# Altium footprint library con-samtec.PCBLIB: 805 footprints (part 14 of 55)
Each footprint in its own frame and in the unit in brackets; x right, y up, seen from the top. Pads: shape width x height; smd on the part's side, far side on the other; paste and mask are expansions set on the pad; w line width, h text height; cw(c..) or ccw(c..) is an arc to the next point about the centre after c.
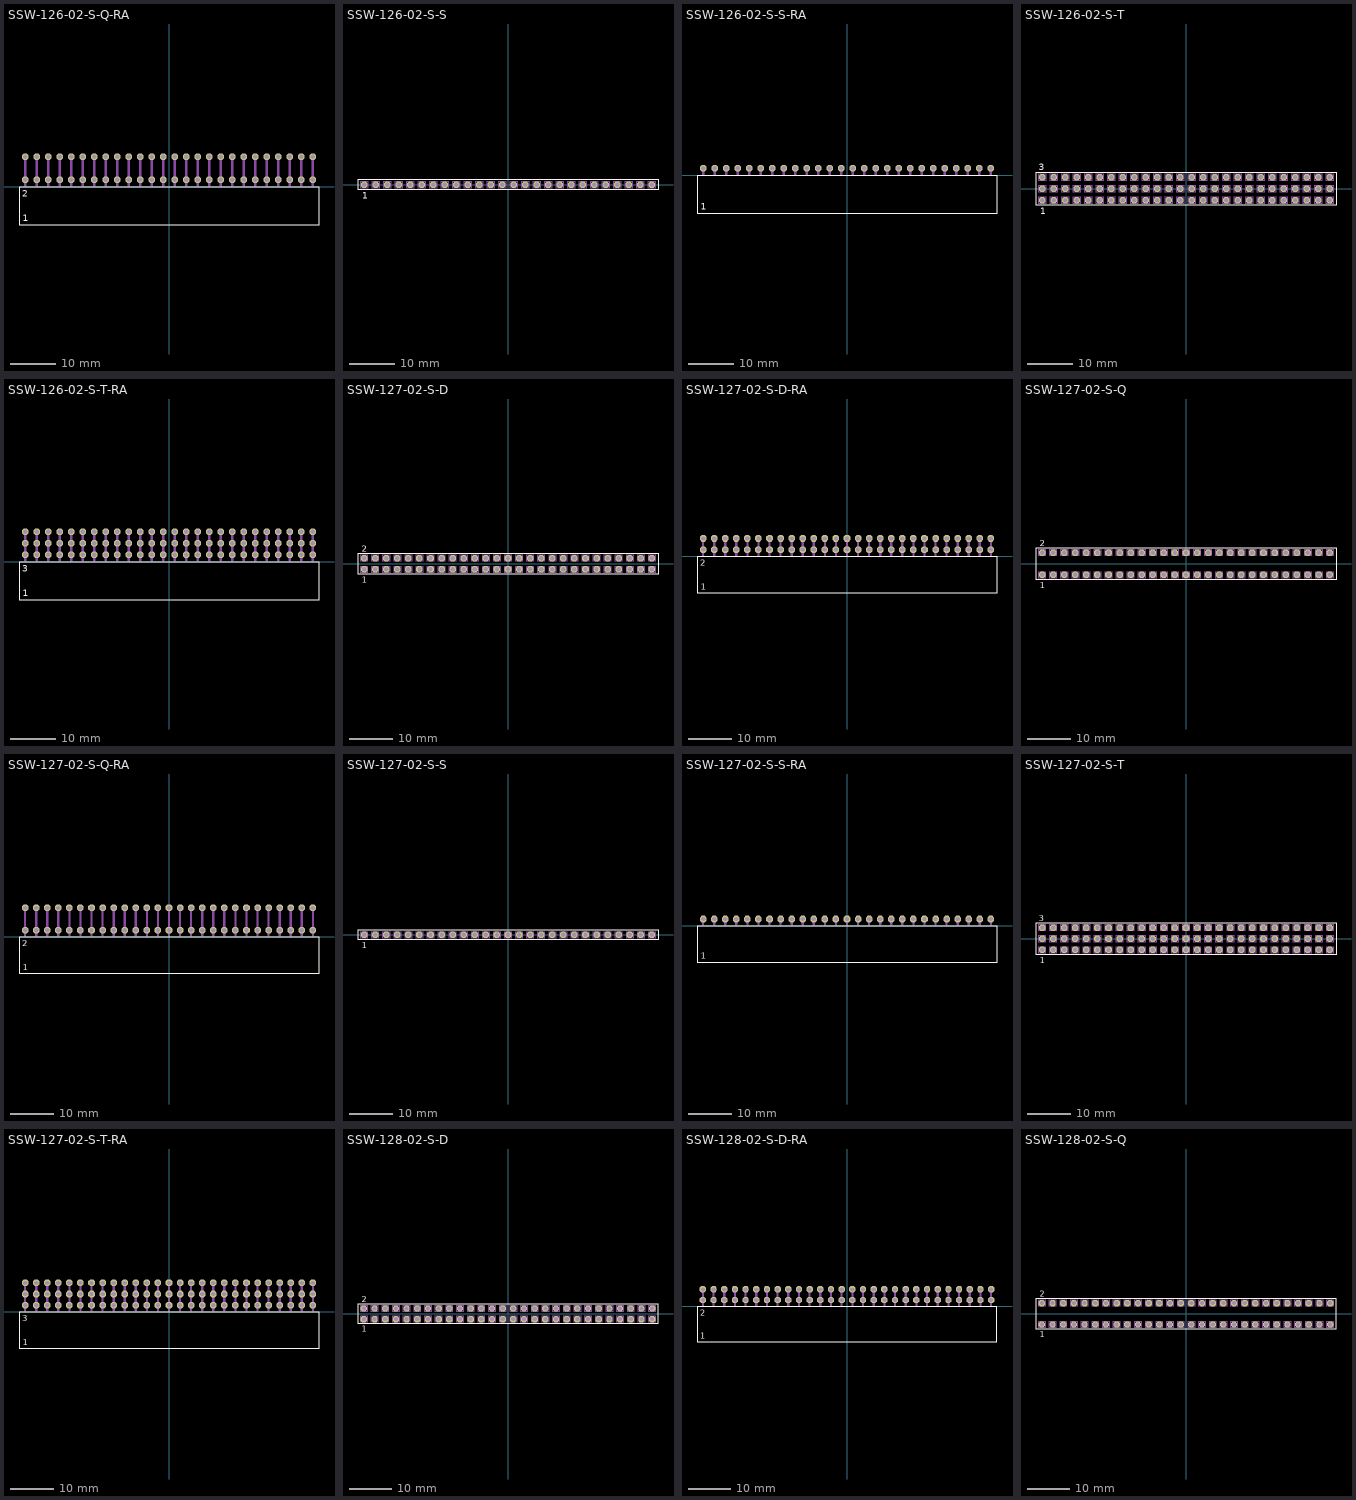
[diagram p13: the footprints below, top view; thin cyan lines are the x and y axes]

## SSW-126-02-S-Q-RA [mil]
pads (52):
  oct 59.06x59.06 hole 39.37: 1(-1250,60) 2(-1250,260) 3(-1150,60) 4(-1150,260) 5(-1050,60) 6(-1050,260) 7(-950,60) 8(-950,260) 9(-850,60) 10(-850,260) 11(-750,60) 12(-750,260) 13(-650,60) 14(-650,260) 15(-550,60) 16(-550,260) 17(-450,60) 18(-450,260) 19(-350,60) 20(-350,260) 21(-250,60) 22(-250,260) 23(-150,60) 24(-150,260) 25(-50,60) 26(-50,260) 27(50,60) 28(50,260) 29(150,60) 30(150,260) 31(250,60) 32(250,260) 33(350,60) 34(350,260) 35(450,60) 36(450,260) 37(550,60) 38(550,260) 39(650,60) 40(650,260) 41(750,60) 42(750,260) 43(850,60) 44(850,260) 45(950,60) 46(950,260) 47(1050,60) 48(1050,260) 49(1150,60) 50(1150,260) 51(1250,60) 52(1250,260)
Top Overlay:
  lines w8: -1305.08,-330.55 1305.08,-330.55 1305.08,-4.17 -1305.08,-4.17 -1305.08,-330.55
  text "1" at -1273.43,-301.18 h56.1
  text "2" at -1276.38,-86.61 h56.1
Mechanical 16:
  rectangle: -1260,0 -1240,270
  rectangle: -1160,0 -1140,270
  rectangle: -1060,0 -1040,270
  rectangle: -960,0 -940,270
  rectangle: -860,0 -840,270
  rectangle: -760,0 -740,270
  rectangle: -660,0 -640,270
  rectangle: -560,0 -540,270
  rectangle: -460,0 -440,270
  rectangle: -360,0 -340,270
  rectangle: -260,0 -240,270
  rectangle: -160,0 -140,270
  rectangle: -60,0 -40,270
  rectangle: 40,0 60,270
  rectangle: 140,0 160,270
  rectangle: 240,0 260,270
  rectangle: 340,0 360,270
  rectangle: 440,0 460,270
  rectangle: 540,0 560,270
  rectangle: 640,0 660,270
  rectangle: 740,0 760,270
  rectangle: 840,0 860,270
  rectangle: 940,0 960,270
  rectangle: 1040,0 1060,270
  rectangle: 1140,0 1160,270
  rectangle: 1240,0 1260,270

## SSW-126-02-S-S [mm]
pads (26):
  oct 1.5x1.5 hole 1: 1(-31.75,0) 2(-29.21,0) 3(-26.67,0) 4(-24.13,0) 5(-21.59,0) 6(-19.05,0) 7(-16.51,0) 8(-13.97,0) 9(-11.43,0) 10(-8.89,0) 11(-6.35,0) 12(-3.81,0) 13(-1.27,0) 14(1.27,0) 15(3.81,0) 16(6.35,0) 17(8.89,0) 18(11.43,0) 19(13.97,0) 20(16.51,0) 21(19.05,0) 22(21.59,0) 23(24.13,0) 24(26.67,0) 25(29.21,0) 26(31.75,0)
Top Overlay:
  lines w0.203: -33.149,-1.155 33.149,-1.155 33.149,1.155 -33.149,1.155 -33.149,-1.155
  text "1" at -32.258,-3.048 h1.42
Mechanical 16:
  lines w0.203: -32.495,-0.745 -30.995,-0.745 -30.995,0.755 -32.495,0.755 -32.495,-0.745 ; -29.955,-0.745 -28.455,-0.745 -28.455,0.755 -29.955,0.755 -29.955,-0.745 ; -27.415,-0.745 -25.915,-0.745 -25.915,0.755 -27.415,0.755 -27.415,-0.745 ; -24.875,-0.745 -23.375,-0.745 -23.375,0.755 -24.875,0.755 -24.875,-0.745 ; -22.335,-0.745 -20.835,-0.745 -20.835,0.755 -22.335,0.755 -22.335,-0.745 ; -19.795,-0.745 -18.295,-0.745 -18.295,0.755 -19.795,0.755 -19.795,-0.745 ; -17.255,-0.745 -15.755,-0.745 -15.755,0.755 -17.255,0.755 -17.255,-0.745 ; -14.715,-0.745 -13.215,-0.745 -13.215,0.755 -14.715,0.755 -14.715,-0.745 ; -12.175,-0.745 -10.675,-0.745 -10.675,0.755 -12.175,0.755 -12.175,-0.745 ; -9.635,-0.745 -8.135,-0.745 -8.135,0.755 -9.635,0.755 -9.635,-0.745 ; -7.095,-0.745 -5.595,-0.745 -5.595,0.755 -7.095,0.755 -7.095,-0.745 ; -4.555,-0.745 -3.055,-0.745 -3.055,0.755 -4.555,0.755 -4.555,-0.745 ; -2.015,-0.745 -0.515,-0.745 -0.515,0.755 -2.015,0.755 -2.015,-0.745 ; 0.525,-0.745 2.025,-0.745 2.025,0.755 0.525,0.755 0.525,-0.745 ; 3.065,-0.745 4.565,-0.745 4.565,0.755 3.065,0.755 3.065,-0.745 ; 5.605,-0.745 7.105,-0.745 7.105,0.755 5.605,0.755 5.605,-0.745 ; 8.145,-0.745 9.645,-0.745 9.645,0.755 8.145,0.755 8.145,-0.745 ; 10.685,-0.745 12.185,-0.745 12.185,0.755 10.685,0.755 10.685,-0.745 ; 13.225,-0.745 14.725,-0.745 14.725,0.755 13.225,0.755 13.225,-0.745 ; 15.765,-0.745 17.265,-0.745 17.265,0.755 15.765,0.755 15.765,-0.745 ; 18.305,-0.745 19.805,-0.745 19.805,0.755 18.305,0.755 18.305,-0.745 ; 20.845,-0.745 22.345,-0.745 22.345,0.755 20.845,0.755 20.845,-0.745 ; 23.385,-0.745 24.885,-0.745 24.885,0.755 23.385,0.755 23.385,-0.745 ; 25.925,-0.745 27.425,-0.745 27.425,0.755 25.925,0.755 25.925,-0.745 ; 28.465,-0.745 29.965,-0.745 29.965,0.755 28.465,0.755 28.465,-0.745 ; 31.005,-0.745 32.505,-0.745 32.505,0.755 31.005,0.755 31.005,-0.745

## SSW-126-02-S-S-RA [mil]
pads (26):
  oct 59.06x59.06 hole 39.37: 1(-1250,60) 2(-1150,60) 3(-1050,60) 4(-950,60) 5(-850,60) 6(-750,60) 7(-650,60) 8(-550,60) 9(-450,60) 10(-350,60) 11(-250,60) 12(-150,60) 13(-50,60) 14(50,60) 15(150,60) 16(250,60) 17(350,60) 18(450,60) 19(550,60) 20(650,60) 21(750,60) 22(850,60) 23(950,60) 24(1050,60) 25(1150,60) 26(1250,60)
Top Overlay:
  lines w8: -1305.08,-330.55 1305.08,-330.55 1305.08,-4.17 -1305.08,-4.17 -1305.08,-330.55
  text "1" at -1273.43,-301.18 h56.1
Mechanical 16:
  rectangle: -1260,0 -1240,70
  rectangle: -1160,0 -1140,70
  rectangle: -1060,0 -1040,70
  rectangle: -960,0 -940,70
  rectangle: -860,0 -840,70
  rectangle: -760,0 -740,70
  rectangle: -660,0 -640,70
  rectangle: -560,0 -540,70
  rectangle: -460,0 -440,70
  rectangle: -360,0 -340,70
  rectangle: -260,0 -240,70
  rectangle: -160,0 -140,70
  rectangle: -60,0 -40,70
  rectangle: 40,0 60,70
  rectangle: 140,0 160,70
  rectangle: 240,0 260,70
  rectangle: 340,0 360,70
  rectangle: 440,0 460,70
  rectangle: 540,0 560,70
  rectangle: 640,0 660,70
  rectangle: 740,0 760,70
  rectangle: 840,0 860,70
  rectangle: 940,0 960,70
  rectangle: 1040,0 1060,70
  rectangle: 1140,0 1160,70
  rectangle: 1240,0 1260,70

## SSW-126-02-S-T [mm]
pads (78):
  oct 1.5x1.5 hole 1: 1(-31.75,-2.54) 2(-31.75,0) 3(-31.75,2.54) 4(-29.21,-2.54) 5(-29.21,0) 6(-29.21,2.54) 7(-26.67,-2.54) 8(-26.67,0) 9(-26.67,2.54) 10(-24.13,-2.54) 11(-24.13,0) 12(-24.13,2.54) 13(-21.59,-2.54) 14(-21.59,0) 15(-21.59,2.54) 16(-19.05,-2.54) 17(-19.05,0) 18(-19.05,2.54) 19(-16.51,-2.54) 20(-16.51,0) 21(-16.51,2.54) 22(-13.97,-2.54) 23(-13.97,0) 24(-13.97,2.54) 25(-11.43,-2.54) 26(-11.43,0) 27(-11.43,2.54) 28(-8.89,-2.54) 29(-8.89,0) 30(-8.89,2.54) 31(-6.35,-2.54) 32(-6.35,0) 33(-6.35,2.54) 34(-3.81,-2.54) 35(-3.81,0) 36(-3.81,2.54) 37(-1.27,-2.54) 38(-1.27,0) 39(-1.27,2.54) 40(1.27,-2.54) 41(1.27,0) 42(1.27,2.54) 43(3.81,-2.54) 44(3.81,0) 45(3.81,2.54) 46(6.35,-2.54) 47(6.35,0) 48(6.35,2.54) 49(8.89,-2.54) 50(8.89,0) 51(8.89,2.54) 52(11.43,-2.54) 53(11.43,0) 54(11.43,2.54) 55(13.97,-2.54) 56(13.97,0) 57(13.97,2.54) 58(16.51,-2.54) 59(16.51,0) 60(16.51,2.54) 61(19.05,-2.54) 62(19.05,0) 63(19.05,2.54) 64(21.59,-2.54) 65(21.59,0) 66(21.59,2.54) 67(24.13,-2.54) 68(24.13,0) 69(24.13,2.54) 70(26.67,-2.54) 71(26.67,0) 72(26.67,2.54) 73(29.21,-2.54) 74(29.21,0) 75(29.21,2.54) 76(31.75,-2.54) 77(31.75,0) 78(31.75,2.54)
Top Overlay:
  lines w0.203: -33.149,-3.695 33.149,-3.695 33.149,3.695 -33.149,3.695 -33.149,-3.695
  text "1" at -32.258,-5.588 h1.42
  text "3" at -32.512,4.064 h1.42
Mechanical 16:
  drawing of 312 lines, arcs and shapes, not listed

## SSW-126-02-S-T-RA [mil]
pads (78):
  oct 59.06x59.06 hole 39.37: 1(-1250,60) 2(-1250,160) 3(-1250,260) 4(-1150,60) 5(-1150,160) 6(-1150,260) 7(-1050,60) 8(-1050,160) 9(-1050,260) 10(-950,60) 11(-950,160) 12(-950,260) 13(-850,60) 14(-850,160) 15(-850,260) 16(-750,60) 17(-750,160) 18(-750,260) 19(-650,60) 20(-650,160) 21(-650,260) 22(-550,60) 23(-550,160) 24(-550,260) 25(-450,60) 26(-450,160) 27(-450,260) 28(-350,60) 29(-350,160) 30(-350,260) 31(-250,60) 32(-250,160) 33(-250,260) 34(-150,60) 35(-150,160) 36(-150,260) 37(-50,60) 38(-50,160) 39(-50,260) 40(50,60) 41(50,160) 42(50,260) 43(150,60) 44(150,160) 45(150,260) 46(250,60) 47(250,160) 48(250,260) 49(350,60) 50(350,160) 51(350,260) 52(450,60) 53(450,160) 54(450,260) 55(550,60) 56(550,160) 57(550,260) 58(650,60) 59(650,160) 60(650,260) 61(750,60) 62(750,160) 63(750,260) 64(850,60) 65(850,160) 66(850,260) 67(950,60) 68(950,160) 69(950,260) 70(1050,60) 71(1050,160) 72(1050,260) 73(1150,60) 74(1150,160) 75(1150,260) 76(1250,60) 77(1250,160) 78(1250,260)
Top Overlay:
  lines w8: -1305.08,-330.55 1305.08,-330.55 1305.08,-4.17 -1305.08,-4.17 -1305.08,-330.55
  text "1" at -1273.43,-301.18 h56.1
  text "3" at -1276.38,-86.61 h56.1
Mechanical 16:
  rectangle: -1260,0 -1240,270
  rectangle: -1160,0 -1140,270
  rectangle: -1060,0 -1040,270
  rectangle: -960,0 -940,270
  rectangle: -860,0 -840,270
  rectangle: -760,0 -740,270
  rectangle: -660,0 -640,270
  rectangle: -560,0 -540,270
  rectangle: -460,0 -440,270
  rectangle: -360,0 -340,270
  rectangle: -260,0 -240,270
  rectangle: -160,0 -140,270
  rectangle: -60,0 -40,270
  rectangle: 40,0 60,270
  rectangle: 140,0 160,270
  rectangle: 240,0 260,270
  rectangle: 340,0 360,270
  rectangle: 440,0 460,270
  rectangle: 540,0 560,270
  rectangle: 640,0 660,270
  rectangle: 740,0 760,270
  rectangle: 840,0 860,270
  rectangle: 940,0 960,270
  rectangle: 1040,0 1060,270
  rectangle: 1140,0 1160,270
  rectangle: 1240,0 1260,270

## SSW-127-02-S-D [mm]
pads (54):
  oct 1.5x1.5 hole 1: 1(-33.02,-1.27) 2(-33.02,1.27) 3(-30.48,-1.27) 4(-30.48,1.27) 5(-27.94,-1.27) 6(-27.94,1.27) 7(-25.4,-1.27) 8(-25.4,1.27) 9(-22.86,-1.27) 10(-22.86,1.27) 11(-20.32,-1.27) 12(-20.32,1.27) 13(-17.78,-1.27) 14(-17.78,1.27) 15(-15.24,-1.27) 16(-15.24,1.27) 17(-12.7,-1.27) 18(-12.7,1.27) 19(-10.16,-1.27) 20(-10.16,1.27) 21(-7.62,-1.27) 22(-7.62,1.27) 23(-5.08,-1.27) 24(-5.08,1.27) 25(-2.54,-1.27) 26(-2.54,1.27) 27(0,-1.27) 28(0,1.27) 29(2.54,-1.27) 30(2.54,1.27) 31(5.08,-1.27) 32(5.08,1.27) 33(7.62,-1.27) 34(7.62,1.27) 35(10.16,-1.27) 36(10.16,1.27) 37(12.7,-1.27) 38(12.7,1.27) 39(15.24,-1.27) 40(15.24,1.27) 41(17.78,-1.27) 42(17.78,1.27) 43(20.32,-1.27) 44(20.32,1.27) 45(22.86,-1.27) 46(22.86,1.27) 47(25.4,-1.27) 48(25.4,1.27) 49(27.94,-1.27) 50(27.94,1.27) 51(30.48,-1.27) 52(30.48,1.27) 53(33.02,-1.27) 54(33.02,1.27)
Top Overlay:
  lines w0.203: -34.419,-2.425 34.419,-2.425 34.419,2.425 -34.419,2.425 -34.419,-2.425
  text "1" at -33.528,-4.318 h1.42
  text "2" at -33.528,2.794 h1.42
Mechanical 16:
  drawing of 216 lines, arcs and shapes, not listed

## SSW-127-02-S-D-RA [mil]
pads (54):
  oct 59.06x59.06 hole 39.37: 1(-1300,60) 2(-1300,160) 3(-1200,60) 4(-1200,160) 5(-1100,60) 6(-1100,160) 7(-1000,60) 8(-1000,160) 9(-900,60) 10(-900,160) 11(-800,60) 12(-800,160) 13(-700,60) 14(-700,160) 15(-600,60) 16(-600,160) 17(-500,60) 18(-500,160) 19(-400,60) 20(-400,160) 21(-300,60) 22(-300,160) 23(-200,60) 24(-200,160) 25(-100,60) 26(-100,160) 27(0,60) 28(0,160) 29(100,60) 30(100,160) 31(200,60) 32(200,160) 33(300,60) 34(300,160) 35(400,60) 36(400,160) 37(500,60) 38(500,160) 39(600,60) 40(600,160) 41(700,60) 42(700,160) 43(800,60) 44(800,160) 45(900,60) 46(900,160) 47(1000,60) 48(1000,160) 49(1100,60) 50(1100,160) 51(1200,60) 52(1200,160) 53(1300,60) 54(1300,160)
Top Overlay:
  lines w8: -1355.08,-330.55 1355.08,-330.55 1355.08,-4.17 -1355.08,-4.17 -1355.08,-330.55
  text "1" at -1323.43,-301.18 h56.1
  text "2" at -1326.38,-86.61 h56.1
Mechanical 16:
  rectangle: -1310,0 -1290,170
  rectangle: -1210,0 -1190,170
  rectangle: -1110,0 -1090,170
  rectangle: -1010,0 -990,170
  rectangle: -910,0 -890,170
  rectangle: -810,0 -790,170
  rectangle: -710,0 -690,170
  rectangle: -610,0 -590,170
  rectangle: -510,0 -490,170
  rectangle: -410,0 -390,170
  rectangle: -310,0 -290,170
  rectangle: -210,0 -190,170
  rectangle: -110,0 -90,170
  rectangle: -10,0 10,170
  rectangle: 90,0 110,170
  rectangle: 190,0 210,170
  rectangle: 290,0 310,170
  rectangle: 390,0 410,170
  rectangle: 490,0 510,170
  rectangle: 590,0 610,170
  rectangle: 690,0 710,170
  rectangle: 790,0 810,170
  rectangle: 890,0 910,170
  rectangle: 990,0 1010,170
  rectangle: 1090,0 1110,170
  rectangle: 1190,0 1210,170
  rectangle: 1290,0 1310,170

## SSW-127-02-S-Q [mm]
pads (54):
  oct 1.5x1.5 hole 1: 1(-33.02,-2.54) 2(-33.02,2.54) 3(-30.48,-2.54) 4(-30.48,2.54) 5(-27.94,-2.54) 6(-27.94,2.54) 7(-25.4,-2.54) 8(-25.4,2.54) 9(-22.86,-2.54) 10(-22.86,2.54) 11(-20.32,-2.54) 12(-20.32,2.54) 13(-17.78,-2.54) 14(-17.78,2.54) 15(-15.24,-2.54) 16(-15.24,2.54) 17(-12.7,-2.54) 18(-12.7,2.54) 19(-10.16,-2.54) 20(-10.16,2.54) 21(-7.62,-2.54) 22(-7.62,2.54) 23(-5.08,-2.54) 24(-5.08,2.54) 25(-2.54,-2.54) 26(-2.54,2.54) 27(0,-2.54) 28(0,2.54) 29(2.54,-2.54) 30(2.54,2.54) 31(5.08,-2.54) 32(5.08,2.54) 33(7.62,-2.54) 34(7.62,2.54) 35(10.16,-2.54) 36(10.16,2.54) 37(12.7,-2.54) 38(12.7,2.54) 39(15.24,-2.54) 40(15.24,2.54) 41(17.78,-2.54) 42(17.78,2.54) 43(20.32,-2.54) 44(20.32,2.54) 45(22.86,-2.54) 46(22.86,2.54) 47(25.4,-2.54) 48(25.4,2.54) 49(27.94,-2.54) 50(27.94,2.54) 51(30.48,-2.54) 52(30.48,2.54) 53(33.02,-2.54) 54(33.02,2.54)
Top Overlay:
  lines w0.203: -34.419,-3.695 34.419,-3.695 34.419,3.695 -34.419,3.695 -34.419,-3.695
  text "1" at -33.528,-5.588 h1.42
  text "2" at -33.528,4.064 h1.42
Mechanical 16:
  drawing of 216 lines, arcs and shapes, not listed

## SSW-127-02-S-Q-RA [mil]
pads (54):
  oct 59.06x59.06 hole 39.37: 1(-1300,60) 2(-1300,260) 3(-1200,60) 4(-1200,260) 5(-1100,60) 6(-1100,260) 7(-1000,60) 8(-1000,260) 9(-900,60) 10(-900,260) 11(-800,60) 12(-800,260) 13(-700,60) 14(-700,260) 15(-600,60) 16(-600,260) 17(-500,60) 18(-500,260) 19(-400,60) 20(-400,260) 21(-300,60) 22(-300,260) 23(-200,60) 24(-200,260) 25(-100,60) 26(-100,260) 27(0,60) 28(0,260) 29(100,60) 30(100,260) 31(200,60) 32(200,260) 33(300,60) 34(300,260) 35(400,60) 36(400,260) 37(500,60) 38(500,260) 39(600,60) 40(600,260) 41(700,60) 42(700,260) 43(800,60) 44(800,260) 45(900,60) 46(900,260) 47(1000,60) 48(1000,260) 49(1100,60) 50(1100,260) 51(1200,60) 52(1200,260) 53(1300,60) 54(1300,260)
Top Overlay:
  lines w8: -1355.08,-330.55 1355.08,-330.55 1355.08,-4.17 -1355.08,-4.17 -1355.08,-330.55
  text "1" at -1323.43,-301.18 h56.1
  text "2" at -1326.38,-86.61 h56.1
Mechanical 16:
  rectangle: -1310,0 -1290,270
  rectangle: -1210,0 -1190,270
  rectangle: -1110,0 -1090,270
  rectangle: -1010,0 -990,270
  rectangle: -910,0 -890,270
  rectangle: -810,0 -790,270
  rectangle: -710,0 -690,270
  rectangle: -610,0 -590,270
  rectangle: -510,0 -490,270
  rectangle: -410,0 -390,270
  rectangle: -310,0 -290,270
  rectangle: -210,0 -190,270
  rectangle: -110,0 -90,270
  rectangle: -10,0 10,270
  rectangle: 90,0 110,270
  rectangle: 190,0 210,270
  rectangle: 290,0 310,270
  rectangle: 390,0 410,270
  rectangle: 490,0 510,270
  rectangle: 590,0 610,270
  rectangle: 690,0 710,270
  rectangle: 790,0 810,270
  rectangle: 890,0 910,270
  rectangle: 990,0 1010,270
  rectangle: 1090,0 1110,270
  rectangle: 1190,0 1210,270
  rectangle: 1290,0 1310,270

## SSW-127-02-S-S [mm]
pads (27):
  oct 1.5x1.5 hole 1: 1(-33.02,0) 2(-30.48,0) 3(-27.94,0) 4(-25.4,0) 5(-22.86,0) 6(-20.32,0) 7(-17.78,0) 8(-15.24,0) 9(-12.7,0) 10(-10.16,0) 11(-7.62,0) 12(-5.08,0) 13(-2.54,0) 14(0,0) 15(2.54,0) 16(5.08,0) 17(7.62,0) 18(10.16,0) 19(12.7,0) 20(15.24,0) 21(17.78,0) 22(20.32,0) 23(22.86,0) 24(25.4,0) 25(27.94,0) 26(30.48,0) 27(33.02,0)
Top Overlay:
  lines w0.203: -34.419,-1.155 34.419,-1.155 34.419,1.155 -34.419,1.155 -34.419,-1.155
  text "1" at -33.528,-3.048 h1.42
Mechanical 16:
  lines w0.203: -33.765,-0.745 -32.265,-0.745 -32.265,0.755 -33.765,0.755 -33.765,-0.745 ; -31.225,-0.745 -29.725,-0.745 -29.725,0.755 -31.225,0.755 -31.225,-0.745 ; -28.685,-0.745 -27.185,-0.745 -27.185,0.755 -28.685,0.755 -28.685,-0.745 ; -26.145,-0.745 -24.645,-0.745 -24.645,0.755 -26.145,0.755 -26.145,-0.745 ; -23.605,-0.745 -22.105,-0.745 -22.105,0.755 -23.605,0.755 -23.605,-0.745 ; -21.065,-0.745 -19.565,-0.745 -19.565,0.755 -21.065,0.755 -21.065,-0.745 ; -18.525,-0.745 -17.025,-0.745 -17.025,0.755 -18.525,0.755 -18.525,-0.745 ; -15.985,-0.745 -14.485,-0.745 -14.485,0.755 -15.985,0.755 -15.985,-0.745 ; -13.445,-0.745 -11.945,-0.745 -11.945,0.755 -13.445,0.755 -13.445,-0.745 ; -10.905,-0.745 -9.405,-0.745 -9.405,0.755 -10.905,0.755 -10.905,-0.745 ; -8.365,-0.745 -6.865,-0.745 -6.865,0.755 -8.365,0.755 -8.365,-0.745 ; -5.825,-0.745 -4.325,-0.745 -4.325,0.755 -5.825,0.755 -5.825,-0.745 ; -3.285,-0.745 -1.785,-0.745 -1.785,0.755 -3.285,0.755 -3.285,-0.745 ; -0.745,-0.745 0.755,-0.745 0.755,0.755 -0.745,0.755 -0.745,-0.745 ; 1.795,-0.745 3.295,-0.745 3.295,0.755 1.795,0.755 1.795,-0.745 ; 4.335,-0.745 5.835,-0.745 5.835,0.755 4.335,0.755 4.335,-0.745 ; 6.875,-0.745 8.375,-0.745 8.375,0.755 6.875,0.755 6.875,-0.745 ; 9.415,-0.745 10.915,-0.745 10.915,0.755 9.415,0.755 9.415,-0.745 ; 11.955,-0.745 13.455,-0.745 13.455,0.755 11.955,0.755 11.955,-0.745 ; 14.495,-0.745 15.995,-0.745 15.995,0.755 14.495,0.755 14.495,-0.745 ; 17.035,-0.745 18.535,-0.745 18.535,0.755 17.035,0.755 17.035,-0.745 ; 19.575,-0.745 21.075,-0.745 21.075,0.755 19.575,0.755 19.575,-0.745 ; 22.115,-0.745 23.615,-0.745 23.615,0.755 22.115,0.755 22.115,-0.745 ; 24.655,-0.745 26.155,-0.745 26.155,0.755 24.655,0.755 24.655,-0.745 ; 27.195,-0.745 28.695,-0.745 28.695,0.755 27.195,0.755 27.195,-0.745 ; 29.735,-0.745 31.235,-0.745 31.235,0.755 29.735,0.755 29.735,-0.745 ; 32.275,-0.745 33.775,-0.745 33.775,0.755 32.275,0.755 32.275,-0.745

## SSW-127-02-S-S-RA [mil]
pads (27):
  oct 59.06x59.06 hole 39.37: 1(-1300,60) 2(-1200,60) 3(-1100,60) 4(-1000,60) 5(-900,60) 6(-800,60) 7(-700,60) 8(-600,60) 9(-500,60) 10(-400,60) 11(-300,60) 12(-200,60) 13(-100,60) 14(0,60) 15(100,60) 16(200,60) 17(300,60) 18(400,60) 19(500,60) 20(600,60) 21(700,60) 22(800,60) 23(900,60) 24(1000,60) 25(1100,60) 26(1200,60) 27(1300,60)
Top Overlay:
  lines w8: -1355.08,-330.55 1355.08,-330.55 1355.08,-4.17 -1355.08,-4.17 -1355.08,-330.55
  text "1" at -1323.43,-301.18 h56.1
Mechanical 16:
  rectangle: -1310,0 -1290,70
  rectangle: -1210,0 -1190,70
  rectangle: -1110,0 -1090,70
  rectangle: -1010,0 -990,70
  rectangle: -910,0 -890,70
  rectangle: -810,0 -790,70
  rectangle: -710,0 -690,70
  rectangle: -610,0 -590,70
  rectangle: -510,0 -490,70
  rectangle: -410,0 -390,70
  rectangle: -310,0 -290,70
  rectangle: -210,0 -190,70
  rectangle: -110,0 -90,70
  rectangle: -10,0 10,70
  rectangle: 90,0 110,70
  rectangle: 190,0 210,70
  rectangle: 290,0 310,70
  rectangle: 390,0 410,70
  rectangle: 490,0 510,70
  rectangle: 590,0 610,70
  rectangle: 690,0 710,70
  rectangle: 790,0 810,70
  rectangle: 890,0 910,70
  rectangle: 990,0 1010,70
  rectangle: 1090,0 1110,70
  rectangle: 1190,0 1210,70
  rectangle: 1290,0 1310,70

## SSW-127-02-S-T [mm]
pads (81):
  oct 1.5x1.5 hole 1: 1(-33.02,-2.54) 2(-33.02,0) 3(-33.02,2.54) 4(-30.48,-2.54) 5(-30.48,0) 6(-30.48,2.54) 7(-27.94,-2.54) 8(-27.94,0) 9(-27.94,2.54) 10(-25.4,-2.54) 11(-25.4,0) 12(-25.4,2.54) 13(-22.86,-2.54) 14(-22.86,0) 15(-22.86,2.54) 16(-20.32,-2.54) 17(-20.32,0) 18(-20.32,2.54) 19(-17.78,-2.54) 20(-17.78,0) 21(-17.78,2.54) 22(-15.24,-2.54) 23(-15.24,0) 24(-15.24,2.54) 25(-12.7,-2.54) 26(-12.7,0) 27(-12.7,2.54) 28(-10.16,-2.54) 29(-10.16,0) 30(-10.16,2.54) 31(-7.62,-2.54) 32(-7.62,0) 33(-7.62,2.54) 34(-5.08,-2.54) 35(-5.08,0) 36(-5.08,2.54) 37(-2.54,-2.54) 38(-2.54,0) 39(-2.54,2.54) 40(0,-2.54) 41(0,0) 42(0,2.54) 43(2.54,-2.54) 44(2.54,0) 45(2.54,2.54) 46(5.08,-2.54) 47(5.08,0) 48(5.08,2.54) 49(7.62,-2.54) 50(7.62,0) 51(7.62,2.54) 52(10.16,-2.54) 53(10.16,0) 54(10.16,2.54) 55(12.7,-2.54) 56(12.7,0) 57(12.7,2.54) 58(15.24,-2.54) 59(15.24,0) 60(15.24,2.54) 61(17.78,-2.54) 62(17.78,0) 63(17.78,2.54) 64(20.32,-2.54) 65(20.32,0) 66(20.32,2.54) 67(22.86,-2.54) 68(22.86,0) 69(22.86,2.54) 70(25.4,-2.54) 71(25.4,0) 72(25.4,2.54) 73(27.94,-2.54) 74(27.94,0) 75(27.94,2.54) 76(30.48,-2.54) 77(30.48,0) 78(30.48,2.54) 79(33.02,-2.54) 80(33.02,0) 81(33.02,2.54)
Top Overlay:
  lines w0.203: -34.419,-3.695 34.419,-3.695 34.419,3.695 -34.419,3.695 -34.419,-3.695
  text "1" at -33.528,-5.588 h1.42
  text "3" at -33.782,4.064 h1.42
Mechanical 16:
  drawing of 324 lines, arcs and shapes, not listed

## SSW-127-02-S-T-RA [mil]
pads (81):
  oct 59.06x59.06 hole 39.37: 1(-1300,60) 2(-1300,160) 3(-1300,260) 4(-1200,60) 5(-1200,160) 6(-1200,260) 7(-1100,60) 8(-1100,160) 9(-1100,260) 10(-1000,60) 11(-1000,160) 12(-1000,260) 13(-900,60) 14(-900,160) 15(-900,260) 16(-800,60) 17(-800,160) 18(-800,260) 19(-700,60) 20(-700,160) 21(-700,260) 22(-600,60) 23(-600,160) 24(-600,260) 25(-500,60) 26(-500,160) 27(-500,260) 28(-400,60) 29(-400,160) 30(-400,260) 31(-300,60) 32(-300,160) 33(-300,260) 34(-200,60) 35(-200,160) 36(-200,260) 37(-100,60) 38(-100,160) 39(-100,260) 40(0,60) 41(0,160) 42(0,260) 43(100,60) 44(100,160) 45(100,260) 46(200,60) 47(200,160) 48(200,260) 49(300,60) 50(300,160) 51(300,260) 52(400,60) 53(400,160) 54(400,260) 55(500,60) 56(500,160) 57(500,260) 58(600,60) 59(600,160) 60(600,260) 61(700,60) 62(700,160) 63(700,260) 64(800,60) 65(800,160) 66(800,260) 67(900,60) 68(900,160) 69(900,260) 70(1000,60) 71(1000,160) 72(1000,260) 73(1100,60) 74(1100,160) 75(1100,260) 76(1200,60) 77(1200,160) 78(1200,260) 79(1300,60) 80(1300,160) 81(1300,260)
Top Overlay:
  lines w8: -1355.08,-330.55 1355.08,-330.55 1355.08,-4.17 -1355.08,-4.17 -1355.08,-330.55
  text "1" at -1323.43,-301.18 h56.1
  text "3" at -1326.38,-86.61 h56.1
Mechanical 16:
  rectangle: -1310,0 -1290,270
  rectangle: -1210,0 -1190,270
  rectangle: -1110,0 -1090,270
  rectangle: -1010,0 -990,270
  rectangle: -910,0 -890,270
  rectangle: -810,0 -790,270
  rectangle: -710,0 -690,270
  rectangle: -610,0 -590,270
  rectangle: -510,0 -490,270
  rectangle: -410,0 -390,270
  rectangle: -310,0 -290,270
  rectangle: -210,0 -190,270
  rectangle: -110,0 -90,270
  rectangle: -10,0 10,270
  rectangle: 90,0 110,270
  rectangle: 190,0 210,270
  rectangle: 290,0 310,270
  rectangle: 390,0 410,270
  rectangle: 490,0 510,270
  rectangle: 590,0 610,270
  rectangle: 690,0 710,270
  rectangle: 790,0 810,270
  rectangle: 890,0 910,270
  rectangle: 990,0 1010,270
  rectangle: 1090,0 1110,270
  rectangle: 1190,0 1210,270
  rectangle: 1290,0 1310,270

## SSW-128-02-S-D [mm]
pads (56):
  oct 1.5x1.5 hole 1: 1(-34.29,-1.27) 2(-34.29,1.27) 3(-31.75,-1.27) 4(-31.75,1.27) 5(-29.21,-1.27) 6(-29.21,1.27) 7(-26.67,-1.27) 8(-26.67,1.27) 9(-24.13,-1.27) 10(-24.13,1.27) 11(-21.59,-1.27) 12(-21.59,1.27) 13(-19.05,-1.27) 14(-19.05,1.27) 15(-16.51,-1.27) 16(-16.51,1.27) 17(-13.97,-1.27) 18(-13.97,1.27) 19(-11.43,-1.27) 20(-11.43,1.27) 21(-8.89,-1.27) 22(-8.89,1.27) 23(-6.35,-1.27) 24(-6.35,1.27) 25(-3.81,-1.27) 26(-3.81,1.27) 27(-1.27,-1.27) 28(-1.27,1.27) 29(1.27,-1.27) 30(1.27,1.27) 31(3.81,-1.27) 32(3.81,1.27) 33(6.35,-1.27) 34(6.35,1.27) 35(8.89,-1.27) 36(8.89,1.27) 37(11.43,-1.27) 38(11.43,1.27) 39(13.97,-1.27) 40(13.97,1.27) 41(16.51,-1.27) 42(16.51,1.27) 43(19.05,-1.27) 44(19.05,1.27) 45(21.59,-1.27) 46(21.59,1.27) 47(24.13,-1.27) 48(24.13,1.27) 49(26.67,-1.27) 50(26.67,1.27) 51(29.21,-1.27) 52(29.21,1.27) 53(31.75,-1.27) 54(31.75,1.27) 55(34.29,-1.27) 56(34.29,1.27)
Top Overlay:
  lines w0.203: -35.689,-2.425 35.689,-2.425 35.689,2.425 -35.689,2.425 -35.689,-2.425
  text "1" at -34.798,-4.318 h1.42
  text "2" at -34.798,2.794 h1.42
Mechanical 16:
  drawing of 224 lines, arcs and shapes, not listed

## SSW-128-02-S-D-RA [mil]
pads (56):
  oct 59.06x59.06 hole 39.37: 1(-1350,60) 2(-1350,160) 3(-1250,60) 4(-1250,160) 5(-1150,60) 6(-1150,160) 7(-1050,60) 8(-1050,160) 9(-950,60) 10(-950,160) 11(-850,60) 12(-850,160) 13(-750,60) 14(-750,160) 15(-650,60) 16(-650,160) 17(-550,60) 18(-550,160) 19(-450,60) 20(-450,160) 21(-350,60) 22(-350,160) 23(-250,60) 24(-250,160) 25(-150,60) 26(-150,160) 27(-50,60) 28(-50,160) 29(50,60) 30(50,160) 31(150,60) 32(150,160) 33(250,60) 34(250,160) 35(350,60) 36(350,160) 37(450,60) 38(450,160) 39(550,60) 40(550,160) 41(650,60) 42(650,160) 43(750,60) 44(750,160) 45(850,60) 46(850,160) 47(950,60) 48(950,160) 49(1050,60) 50(1050,160) 51(1150,60) 52(1150,160) 53(1250,60) 54(1250,160) 55(1350,60) 56(1350,160)
Top Overlay:
  lines w8: -1405.08,-330.55 1405.08,-330.55 1405.08,-4.17 -1405.08,-4.17 -1405.08,-330.55
  text "1" at -1373.43,-301.18 h56.1
  text "2" at -1376.38,-86.61 h56.1
Mechanical 16:
  rectangle: -1360,0 -1340,170
  rectangle: -1260,0 -1240,170
  rectangle: -1160,0 -1140,170
  rectangle: -1060,0 -1040,170
  rectangle: -960,0 -940,170
  rectangle: -860,0 -840,170
  rectangle: -760,0 -740,170
  rectangle: -660,0 -640,170
  rectangle: -560,0 -540,170
  rectangle: -460,0 -440,170
  rectangle: -360,0 -340,170
  rectangle: -260,0 -240,170
  rectangle: -160,0 -140,170
  rectangle: -60,0 -40,170
  rectangle: 40,0 60,170
  rectangle: 140,0 160,170
  rectangle: 240,0 260,170
  rectangle: 340,0 360,170
  rectangle: 440,0 460,170
  rectangle: 540,0 560,170
  rectangle: 640,0 660,170
  rectangle: 740,0 760,170
  rectangle: 840,0 860,170
  rectangle: 940,0 960,170
  rectangle: 1040,0 1060,170
  rectangle: 1140,0 1160,170
  rectangle: 1240,0 1260,170
  rectangle: 1340,0 1360,170

## SSW-128-02-S-Q [mm]
pads (56):
  oct 1.5x1.5 hole 1: 1(-34.29,-2.54) 2(-34.29,2.54) 3(-31.75,-2.54) 4(-31.75,2.54) 5(-29.21,-2.54) 6(-29.21,2.54) 7(-26.67,-2.54) 8(-26.67,2.54) 9(-24.13,-2.54) 10(-24.13,2.54) 11(-21.59,-2.54) 12(-21.59,2.54) 13(-19.05,-2.54) 14(-19.05,2.54) 15(-16.51,-2.54) 16(-16.51,2.54) 17(-13.97,-2.54) 18(-13.97,2.54) 19(-11.43,-2.54) 20(-11.43,2.54) 21(-8.89,-2.54) 22(-8.89,2.54) 23(-6.35,-2.54) 24(-6.35,2.54) 25(-3.81,-2.54) 26(-3.81,2.54) 27(-1.27,-2.54) 28(-1.27,2.54) 29(1.27,-2.54) 30(1.27,2.54) 31(3.81,-2.54) 32(3.81,2.54) 33(6.35,-2.54) 34(6.35,2.54) 35(8.89,-2.54) 36(8.89,2.54) 37(11.43,-2.54) 38(11.43,2.54) 39(13.97,-2.54) 40(13.97,2.54) 41(16.51,-2.54) 42(16.51,2.54) 43(19.05,-2.54) 44(19.05,2.54) 45(21.59,-2.54) 46(21.59,2.54) 47(24.13,-2.54) 48(24.13,2.54) 49(26.67,-2.54) 50(26.67,2.54) 51(29.21,-2.54) 52(29.21,2.54) 53(31.75,-2.54) 54(31.75,2.54) 55(34.29,-2.54) 56(34.29,2.54)
Top Overlay:
  lines w0.203: -35.689,-3.695 35.689,-3.695 35.689,3.695 -35.689,3.695 -35.689,-3.695
  text "1" at -34.798,-5.588 h1.42
  text "2" at -34.798,4.064 h1.42
Mechanical 16:
  drawing of 224 lines, arcs and shapes, not listed